# Altium footprint library ic.PcbLib: 116 footprints (part 8 of 8)
Each footprint in its own frame and in the unit in brackets; x right, y up, seen from the top. Pads: shape width x height; smd on the part's side, far side on the other; paste and mask are expansions set on the pad; w line width, h text height; cw(c..) or ccw(c..) is an arc to the next point about the centre after c.
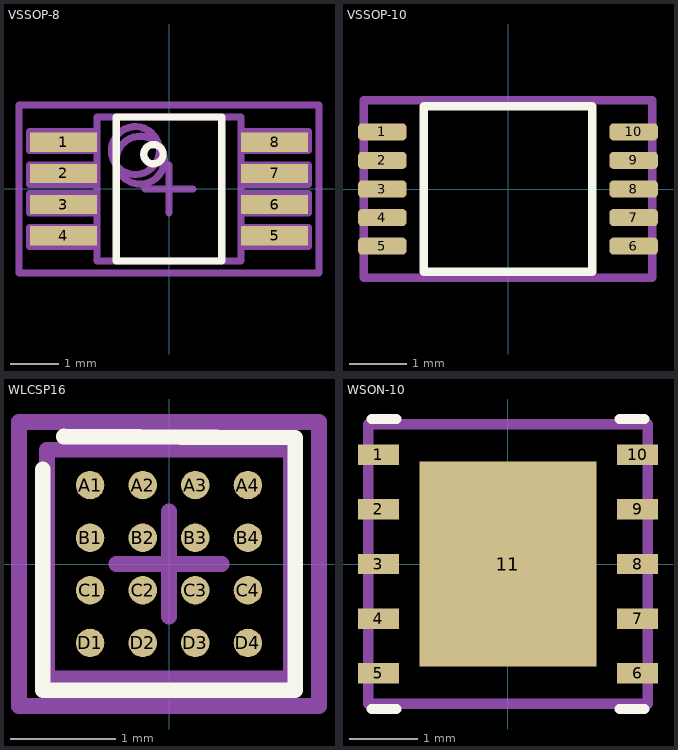
[diagram p7: the footprints below, top view; thin cyan lines are the x and y axes]

## VSSOP-8 [mm] "TSOP, 8-Leads, Body 3,00x3,00mm, Pitch 0,65mm, IPC Medium Density"
height 1.1
pads (8):
  rect 1.4x0.4 smd: 1(-2.2,0.975) 2(-2.2,0.325) 3(-2.2,-0.325) 4(-2.2,-0.975) 5(2.2,-0.975) 6(2.2,-0.325) 7(2.2,0.325) 8(2.2,0.975)
Top Overlay:
  circle w0.15: c-0.325,0.725 r0.2
  lines w0.15: -1.1,-1.5 -1.1,1.5 1.1,1.5 1.1,-1.5 -1.1,-1.5
  text "." at -2.2,1.7 h0.1
Top Courtyard:
  lines w0.15: -0.5,0 0.5,0 ; 0,-0.5 0,0.5 ; -3.125,-1.75 -3.125,1.75 3.125,1.75 3.125,-1.75 -3.125,-1.75
Mechanical 13:
  circle w0.15: c-0.6,0.6 r0.5
  lines w0.15: -1.5,-1.5 -1.5,1.5 1.5,1.5 1.5,-1.5 -1.5,-1.5
Mechanical 29:
  circle w0.15: c-0.7,0.8 r0.5
  lines w0.15: -1.5,-1.2 -2.9,-1.2 -2.9,-0.8 -1.5,-0.8 ; -1.5,-0.5 -2.9,-0.5 -2.9,-0.1 -1.5,-0.1 ; -1.5,0.1 -2.9,0.1 -2.9,0.5 -1.5,0.5 ; -1.5,0.8 -2.9,0.8 -2.9,1.2 -1.5,1.2 ; 1.5,-1.2 2.9,-1.2 2.9,-0.8 1.5,-0.8 ; 1.5,-0.5 2.9,-0.5 2.9,-0.1 1.5,-0.1 ; 1.5,0.1 2.9,0.1 2.9,0.5 1.5,0.5 ; 1.5,0.8 2.9,0.8 2.9,1.2 1.5,1.2 ; -1.5,-1.5 1.5,-1.5 1.5,1.5 -1.5,1.5 -1.5,-1.5
  text ".Designator" at -2.7,2 h1
3D body "VSSOP-8.step": height 1.1, standoff 0, extent -2.45,-1.5 2.45,1.5

## VSSOP-10 [mm] "VSSOP, 10-Leads, Body 3,00x3,00mm, Pitch 0,50mm, IPC High Density"
height 1.1
pads (10):
  rrect50% 0.85x0.3 smd: 1(-2.2,1) 2(-2.2,0.5) 3(-2.2,0) 4(-2.2,-0.5) 5(-2.2,-1) 6(2.2,-1) 7(2.2,-0.5) 8(2.2,0) 9(2.2,0.5) 10(2.2,1)
Top Overlay:
  lines w0.15: -1.475,-1.45 1.475,-1.45 1.475,1.45 -1.475,1.45 -1.475,-1.45
  text "." at -2.255,1.759 h0.1
Top Courtyard:
  lines w0.15: -2.525,-1.55 2.525,-1.55 2.525,1.55 -2.525,1.55 -2.525,-1.55
3D body "VSSOP-10.step": height 1.1, standoff 0, extent -2.45,-1.55 2.45,1.55

## WLCSP16 [mm] "BGA, 16-Leads, Body 2,32x2,17mmx0,60mm, Pitch 0,50mm"
height 0.6
pads (16):
  round 0.27 smd: A1(-0.75,0.75) A2(-0.25,0.75) A3(0.25,0.75) A4(0.75,0.75) B1(-0.75,0.25) B2(-0.25,0.25) B3(0.25,0.25) B4(0.75,0.25) C1(-0.75,-0.25) C2(-0.25,-0.25) C3(0.25,-0.25) C4(0.75,-0.25) D1(-0.75,-0.75) D2(-0.25,-0.75) D3(0.25,-0.75) D4(0.75,-0.75)
Top Overlay:
  lines w0.15: -1.2,0.9 -1.2,-1.2 1.2,-1.2 1.2,1.2 -1,1.21
  text "." at -1.425,1.35 h0.1
Top Courtyard:
  lines w0.15: -0.5,0 0.5,0 ; 0,-0.5 0,0.5 ; -1.425,-1.35 -1.425,1.35 1.425,1.35 1.425,-1.35 -1.425,-1.35
Mechanical 13:
  lines w0.15: -1.16,-1.085 -1.16,1.085 1.16,1.085 1.16,-1.085 -1.16,-1.085
3D body "WLCSP16.step": height 0.6, standoff 0, extent -1.16,-1.085 1.16,1.085

## WSON-10 [mm] "WSON, 10-Leads, Body 4,00x4,00mm, Pitch 0,80mm, Thermal Pad 3,00x2,60mm, IPC High Density"
height 0.8
pads (11):
  rect 0.6x0.3 smd: 1(-1.9,1.6) 2(-1.9,0.8) 3(-1.9,0) 4(-1.9,-0.8) 5(-1.9,-1.6) 6(1.9,-1.6) 7(1.9,-0.8) 8(1.9,0) 9(1.9,0.8) 10(1.9,1.6)
  rect 2.6x3 smd paste-1.3: 11(0,0)
Top Overlay:
  lines w0.15: -2,-2.125 -1.635,-2.125 ; -2,2.125 -1.635,2.125 ; 1.635,-2.125 2,-2.125 ; 1.635,2.125 2,2.125
  text "." at -2.455,2.159 h0.1
Top Paste:
  rectangle: -1.2,0.1 -0.1,1.4
  rectangle: -1.2,-1.4 -0.1,-0.1
  rectangle: 0.1,0.1 1.2,1.4
  rectangle: 0.1,-1.4 1.2,-0.1
Top Courtyard:
  lines w0.1: -0.5,0 0.5,0 ; 0,-0.5 0,0.5
  lines w0.15: -2.05,-2.05 -2.05,2.05 2.05,2.05 2.05,-2.05 -2.05,-2.05
3D body "WSON-10.step": height 0.8, standoff 0, extent -2.001,-2 2.001,2